# Altium footprint library IDETEC.PcbLib: 275 footprints (part 10 of 18)
Each footprint in its own frame and in the unit in brackets; x right, y up, seen from the top. Pads: shape width x height; smd on the part's side, far side on the other; paste and mask are expansions set on the pad; w line width, h text height; cw(c..) or ccw(c..) is an arc to the next point about the centre after c.
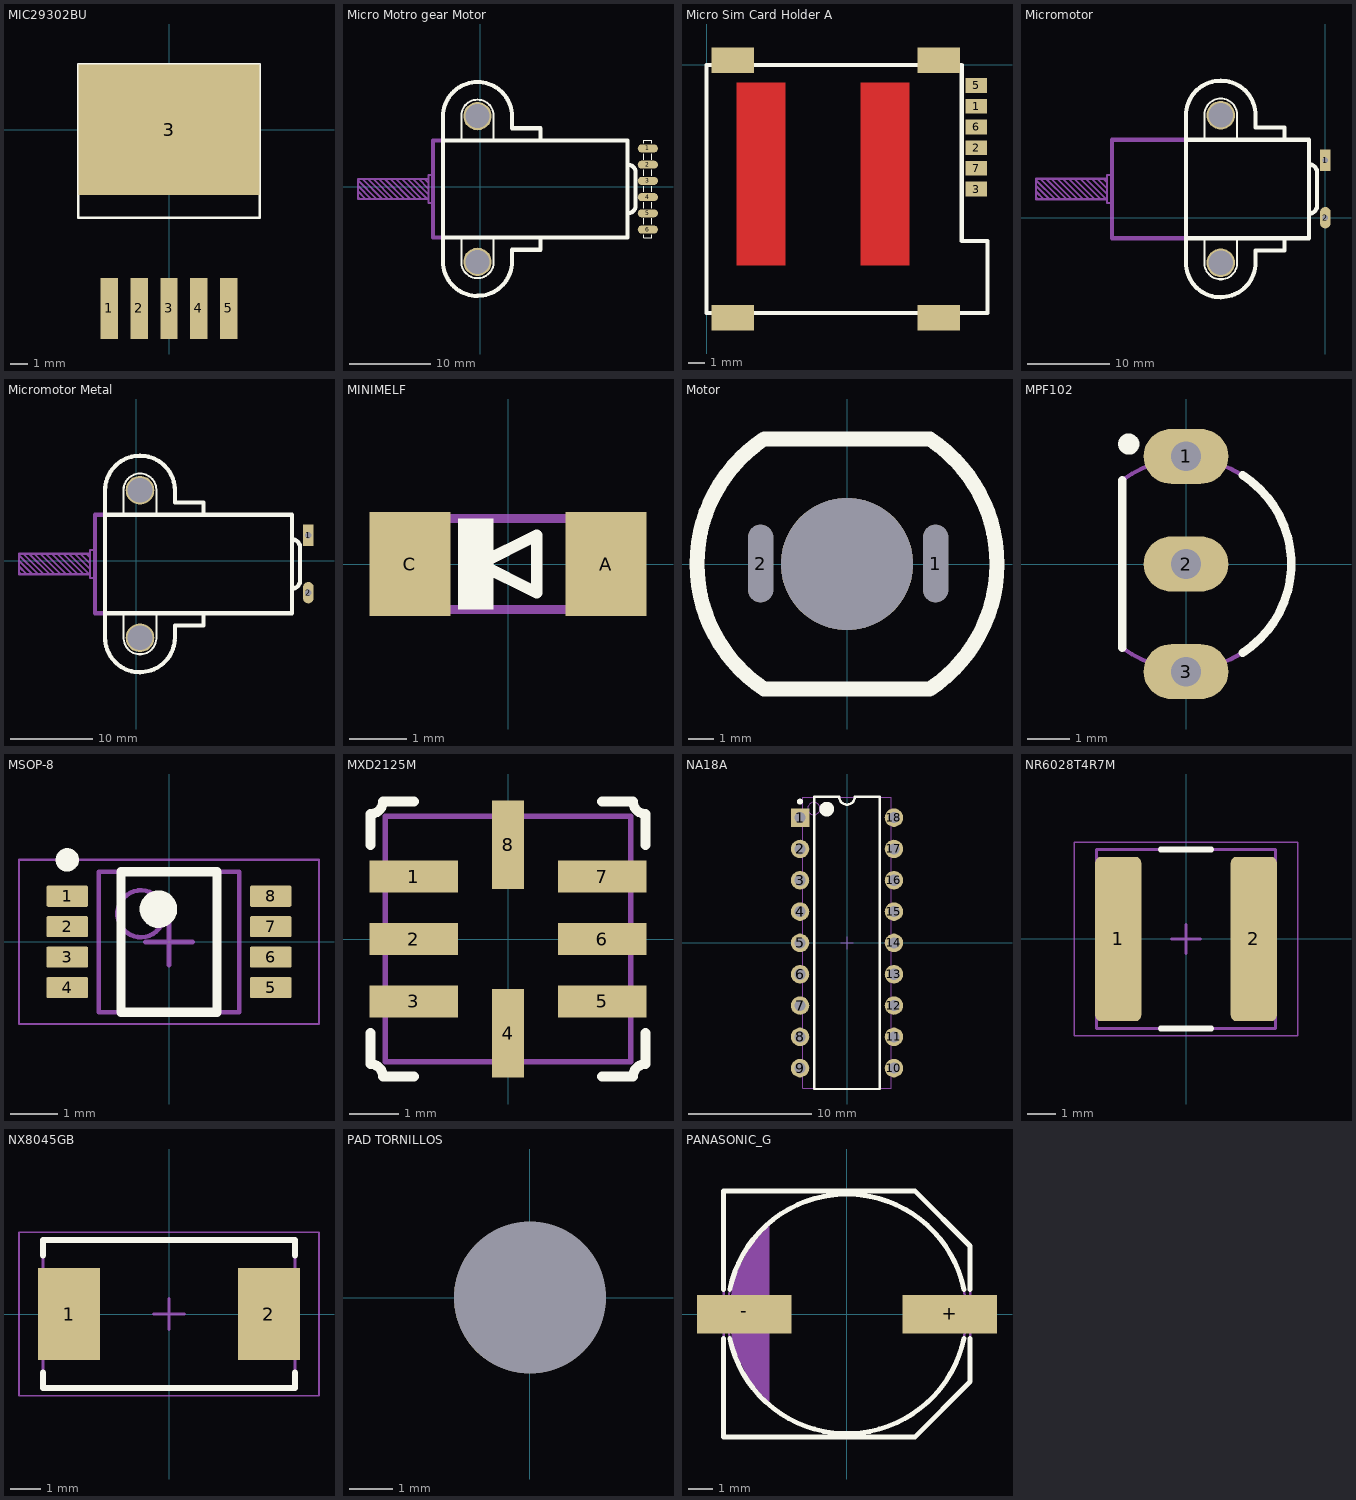
[diagram p9: the footprints below, top view; thin cyan lines are the x and y axes]

## MIC29302BU [mm] "MIC29302BU"
pads (6):
  rect 1x3.5 smd: 1(-3.404,-10.212) 2(-1.702,-10.212) 3(0,-10.212) 4(1.702,-10.212) 5(3.404,-10.212)
  rect 10.363x7.477 smd: 3(0,0)
Top Overlay:
  lines w0.15: -5.181,-5.042 -5.181,3.738 5.181,3.738 5.181,-5.042 -5.181,-5.042
3D body "User Library-TO-263-5.STEP": height 4.56, standoff 0, extent -5.085,-10.815 5.075,3.2

## Micro Motro gear Motor [mm] "micromotor con encoder"
height 3
pads (8):
  oval 2.5x1 smd: 1(20.69,4.75) 2(20.69,2.75) 3(20.69,0.75) 4(20.69,-1.25) 5(20.69,-3.25) 6(20.69,-5.25)
  round 3.5 hole 3: ""(-0.335,-9.25) ""(-0.335,8.75)
Bottom Layer:
  lines w0.051: 21.19,-0.24 21.19,-0.24
Top Overlay:
  lines w0.051: 20.19,-5.89 20.19,-6.29 21.19,-6.29 21.19,-5.89 ; 20.19,-4.62 20.19,-3.88 ; 20.19,-2.62 20.19,-1.88 ; 20.19,-0.62 20.19,0.12 ; 20.19,1.38 20.19,2.12 ; 20.19,3.38 20.19,4.12 ; 20.19,5.38 20.19,5.75 ; 20.19,5.76 21.19,5.76 21.19,5.39 ; 21.19,-4.62 21.19,-3.88 ; 21.19,-2.62 21.19,-1.88 ; 21.19,-0.62 21.19,0.12 ; 21.19,1.38 21.19,2.12 ; 21.19,3.38 21.19,4.12
  lines w0.25: -2.335,-9.375 -2.335,-6.25 ; -2.335,5.75 -2.335,8.825 ; -2.334,8.826 cw(c-0.335,8.775) 1.664,8.826 1.665,5.75 ; -2.331,-9.375 ccw(c-0.335,-9.257) 1.662,-9.375 ; 1.665,-9.375 1.665,-6.35
  lines w0.5: -4.61,5.75 18.19,5.75 18.19,-0.25 18.19,-6.25 -4.61,-6.25 ; -4.585,-6.25 -4.585,-9.25 ccw(c-0.36,-9.225) -0.335,-13.45 ; -4.585,-6.225 -4.585,5.75 -4.585,8.75 cw(c-0.36,8.725) -0.335,12.95 cw(c-0.31,8.725) 3.915,8.75 3.915,7.25 7.415,7.25 7.415,5.75 ; -0.335,-13.425 ccw(c-0.297,-9.213) 3.915,-9.25 3.915,-7.75 7.415,-7.75 7.415,-6.25 ; 18.19,-3.25 ccw(c18.19,-2.25) 19.19,-2.25 19.19,-0.25 19.19,1.75 ccw(c18.19,1.75) 18.19,2.75 ; -4.61,-6.25 -4.61,-6.25
Mechanical 1:
  lines w0.25: -15.085,-1.25 -14.835,-1.5 ; -15.085,-0.55 -14.135,-1.5 ; -15.085,0.15 -13.435,-1.5 ; -15.085,0.825 -12.76,-1.5 ; -14.56,1 -12.06,-1.5 ; -13.86,1 -11.36,-1.5 ; -13.21,1 -10.71,-1.5 ; -12.51,1 -10.01,-1.5 ; -11.81,1 -9.31,-1.5 ; -11.11,1 -8.61,-1.5 ; -10.41,1 -7.91,-1.5 ; -9.71,1 -7.21,-1.5 ; -9.01,1 -6.51,-1.5 ; -8.31,1 -6.41,-0.9 ; -7.61,1 -6.41,-0.2 ; -6.91,1 -6.41,0.5 ; -6.41,1 -15.085,1 -15.085,-1.5 -6.51,-1.5 ; -5.81,-1.95 -6.41,-1.95 -6.41,1.45 -5.81,1.45 ; -6.51,-1.5 -6.51,-1.5
  lines w0.5: -4.61,-6.25 -5.81,-6.25 -5.81,5.75 -4.585,5.75
3D body "sop.step": height 11.5, standoff 0, extent -4.81,-13.62 6.69,13.025
3D body "User Library-hp 1-100.STEP": height 10, standoff 0, extent -13.857,-6.225 19.237,5.775
3D body "Pololu-Wheel.STEP": height 20.98, standoff -10.98, extent -16.028,-15.83 -7.528,16.13

## Micro Sim Card Holder A [mm] "Micro Sim Card Holder A"
pads (10):
  rect 1.34x0.9 smd: 1(16.525,-2.53) 2(16.525,-5.07) 3(16.525,-7.61) 5(16.525,-1.26) 6(16.525,-3.8) 7(16.525,-6.34)
  rect 2.61x1.56 smd: ""(1.61,-15.495) ""(1.61,0.285) ""(14.24,-15.495) ""(14.24,0.285)
Top Layer:
  rectangle: 1.83,-12.3 4.83,-1.08
  rectangle: 9.43,-12.3 12.43,-1.08
Top Overlay:
  lines w0.254: 0,-15.21 0,0 15.64,0 15.64,-10.8 17.21,-10.8 17.21,-15.21 0,-15.21
3D body "2174803-2.stp": height 1.31, standoff -0.58, extent -0.006,-15.352 15.994,0.138

## Micromotor [mm] "gearmotor is a miniature (0.94\" x 0.39\" x 0.47\"), low-current brushed DC motor with 30:1"
height 10
pads (4):
  rect 1.3x2.6 hole 0.65: 1(0,7)
  oval 1.3x2.6 hole 0.65: 2(0,0)
  round 3.5 hole 3: ""(-12.75,-5.5) ""(-12.75,12.5)
Top Overlay:
  lines w0.25: -14.75,-5.625 -14.75,-2.5 ; -14.75,9.5 -14.75,12.575 cw(c-12.75,12.525) -10.751,12.576 -10.75,9.5 ; -14.746,-5.625 ccw(c-12.75,-5.507) -10.754,-5.625 ; -10.75,-5.625 -10.75,-2.6
  lines w0.5: -17,-2.525 -17,9.475 ; -17,9.5 -17,12.5 cw(c-12.775,12.475) -12.75,16.7 cw(c-12.725,12.475) -8.5,12.5 -8.5,11 -5,11 -5,9.5 ; -16.975,9.5 -2,9.5 -2,3.5 -2,-2.5 -17,-2.5 -17,-5.5 ccw(c-12.775,-5.475) -12.75,-9.7 ; -12.75,-9.675 ccw(c-12.712,-5.463) -8.5,-5.5 -8.5,-4 -5,-4 -5,-2.5 ; -2,0.5 ccw(c-2,1.5) -1,1.5 -1,3.5 -1,5.5 ccw(c-2,5.5) -2,6.5
Mechanical 1:
  lines w0.25: -35.275,2.5 -35.025,2.25 ; -35.275,3.2 -34.325,2.25 ; -35.275,3.9 -33.625,2.25 ; -35.275,4.575 -32.95,2.25 ; -34.75,4.75 -32.25,2.25 ; -34.05,4.75 -31.55,2.25 ; -33.4,4.75 -30.9,2.25 ; -32.7,4.75 -30.2,2.25 ; -32,4.75 -29.5,2.25 ; -31.3,4.75 -28.8,2.25 ; -30.6,4.75 -28.1,2.25 ; -29.9,4.75 -27.4,2.25 ; -29.2,4.75 -26.7,2.25 ; -28.5,4.75 -26.6,2.85 ; -27.8,4.75 -26.6,3.55 ; -27.1,4.75 -26.6,4.25 ; -26.6,4.75 -35.275,4.75 -35.275,2.25 -26.7,2.25 ; -26,1.8 -26.6,1.8 -26.6,5.2 -26,5.2 ; -26.7,2.25 -26.7,2.25
  lines w0.5: -16.95,-2.5 -26,-2.5 -26,9.5 -16.95,9.5
3D body "soporte.stp": height 11.5, standoff 0, extent -17.25,-9.82 -5.75,16.825
3D body "User Library-hp 1-100.STEP": height 10, standoff 0, extent -34.047,-2.475 -0.953,9.525
3D body "Pololu-Wheel.STEP": height 20.98, standoff -10.98, extent -36.218,-12.08 -27.718,19.88

## Micromotor Metal [mm] "Mcromotor con soporte adelante"
pads (4):
  rect 1.3x2.6 hole 0.81: 1(21,3.1)
  oval 1.3x2.6 hole 0.81: 2(21,-3.9)
  round 3.5 hole 3: ""(0.475,-9.4) ""(0.475,8.6)
Top Overlay:
  lines w0.25: -1.525,-9.525 -1.525,-6.4 ; -1.525,5.6 -1.525,8.675 ; -1.524,8.676 cw(c0.475,8.625) 2.474,8.676 ; -1.521,-9.525 ccw(c0.475,-9.407) 2.471,-9.525 ; 2.475,-9.525 2.475,-6.5 ; 2.475,5.6 2.475,8.675
  lines w0.5: -3.8,5.6 19,5.6 19,-0.4 19,-6.4 -3.8,-6.4 ; -3.775,-6.4 -3.775,-9.4 ccw(c0.45,-9.375) 0.475,-13.6 ; -3.775,-6.375 -3.775,5.6 -3.775,8.6 cw(c0.45,8.575) 0.475,12.8 cw(c0.5,8.575) 4.725,8.6 4.725,7.1 8.225,7.1 8.225,5.6 ; 0.475,-13.575 ccw(c0.513,-9.363) 4.725,-9.4 4.725,-7.9 8.225,-7.9 8.225,-6.4 ; 19,-3.4 ccw(c19,-2.4) 20,-2.4 20,-0.4 20,1.6 ccw(c19,1.6) 19,2.6 ; -3.8,-6.4 -3.8,-6.4
Mechanical 1:
  lines w0.25: -14.275,-1.4 -14.025,-1.65 ; -14.275,-0.7 -13.325,-1.65 ; -14.275,0 -12.625,-1.65 ; -14.275,0.675 -11.95,-1.65 ; -13.75,0.85 -11.25,-1.65 ; -13.05,0.85 -10.55,-1.65 ; -12.4,0.85 -9.9,-1.65 ; -11.7,0.85 -9.2,-1.65 ; -11,0.85 -8.5,-1.65 ; -10.3,0.85 -7.8,-1.65 ; -9.6,0.85 -7.1,-1.65 ; -8.9,0.85 -6.4,-1.65 ; -8.2,0.85 -5.7,-1.65 ; -7.5,0.85 -5.6,-1.05 ; -6.8,0.85 -5.6,-0.35 ; -6.1,0.85 -5.6,0.35 ; -5.6,0.85 -14.275,0.85 -14.275,-1.65 -5.7,-1.65 ; -5,-2.1 -5.6,-2.1 -5.6,1.3 -5,1.3 ; -5.7,-1.65 -5.7,-1.65
  lines w0.5: -3.8,-6.4 -5,-6.4 -5,5.6 -3.775,5.6
3D body "Pololu-Wheel.STEP": height 20.98, standoff -10.98, extent -15.218,-15.98 -6.718,15.98
3D body "User Library-hp 1-100.STEP": height 10, standoff 0, extent -13.047,-6.375 20.047,5.625
3D body "sop.step": height 11.5, standoff 0, extent -4,-13.77 7.5,12.875

## MINIMELF [mm] "MINIMELF"
pads (2):
  rect 1.4x1.8 smd: A(1.7,0) C(-1.7,0)
Top Overlay:
  rectangle: -0.864,-0.787 -0.254,0.787
  lines w0.203: -0.5,0 0.5,-0.5 0.5,0.5 -0.5,0
Mechanical 16:
  rectangle: 1.295,-0.864 1.854,0.864
  rectangle: -1.854,-0.864 -1.295,0.864
  lines w0.152: -1.321,-0.787 1.321,-0.787 ; -1.321,0.787 1.321,0.787
3D body "User Library-D1206.STEP": height 0.85, standoff 0, extent -1.675,-0.865 1.675,0.865

## Motor [mm]
height 9
pads (3):
  oval 1x3.1 hole 1 slot 3.1 at 90 deg: 1(3.545,0.019) 2(-3.455,0.019)
  round 5.3 hole 5.3 unplated: ""(0,0)
Top Overlay:
  lines w0.6: -3.318,-5 3.303,-5 ; -3.318,-4.999 cw(c0,0) -3.309,5.005 ; -3.306,5 3.323,5 ; 3.303,-5.009 ccw(c0,0) 3.323,4.996
Multi-Layer:
  region: 2.707,-1.96 3.045,-1.031 3.054,-1.129 3.129,-1.309 3.267,-1.447 3.447,-1.521 3.545,-1.531 3.642,-1.521 3.823,-1.447 3.961,-1.309 4.035,-1.129 4.045,-1.031 4.045,1.069 4.035,1.166 3.961,1.347 3.823,1.485 3.642,1.559 3.545,1.569 3.447,1.559 3.267,1.485 3.129,1.347 3.054,1.166 3.045,1.069 2.707,1.998 2.711,2 2.796,2.076 2.991,2.196 3.205,2.277 3.43,2.319 3.545,2.319 3.668,2.319 3.909,2.271 4.137,2.177 4.342,2.04 4.516,1.866 4.653,1.661 4.747,1.434 4.795,1.192 4.795,1.069 4.795,-1.031 4.795,-1.154 4.747,-1.396 4.653,-1.623 4.516,-1.828 4.342,-2.002 4.137,-2.139 3.909,-2.233 3.668,-2.281 3.545,-2.281 3.43,-2.281 3.203,-2.24 2.988,-2.158 2.792,-2.038
  region: -3.955,-1.031 -3.955,1.069 -3.946,1.166 -3.871,1.347 -3.733,1.485 -3.553,1.559 -3.455,1.569 -3.358,1.559 -3.177,1.485 -3.039,1.347 -2.965,1.166 -2.955,1.069 -2.617,1.998 -2.613,2.003 -2.699,2.079 -2.897,2.199 -3.113,2.28 -3.34,2.32 -3.455,2.319 -3.578,2.319 -3.82,2.271 -4.047,2.177 -4.252,2.04 -4.426,1.866 -4.563,1.661 -4.657,1.434 -4.705,1.192 -4.705,1.069 -4.705,-1.031 -4.705,-1.154 -4.657,-1.396 -4.563,-1.623 -4.426,-1.828 -4.252,-2.002 -4.047,-2.139 -3.82,-2.233 -3.578,-2.281 -3.455,-2.281 -3.341,-2.281 -3.115,-2.239 -2.902,-2.158 -2.706,-2.038 -2.621,-1.962 -2.617,-1.96 -2.955,-1.031 -2.965,-1.129 -3.039,-1.309 -3.177,-1.447 -3.358,-1.521 -3.455,-1.531 -3.553,-1.521 -3.733,-1.447 -3.871,-1.309 -3.946,-1.129
3D body "3x1.5.STEP": height 23.01, standoff 17.05, extent -37.984,-7.756 37.984,7.756
3D body "Pololu-Micro-Metal-Gearmotor.STEP": height 21.2, standoff -1.5, extent -5.955,-4.981 6.045,5.019

## MPF102 [mm] "TO, Flat Index; 3 In-Line, Axial Leads; Body Dia. 4.5mm; Leads 0.51 x 0.48 mm (max)"
height 6.86
pads (3):
  oval 2x1.3 hole 0.7: 1(0,2.54) 2(0,0) 3(0,-2.54)
Top Overlay:
  circle w0.25: c-1.35,2.83 r0.125
  lines w0.2: -1.5,-1.98 -1.5,1.98 ; 1.334,-2.096 ccw(c0,0) 1.334,2.096
Mechanical 13:
  lines w0.1: -1.5,-1.98 ccw(c0,0) -1.5,1.98 -1.5,-1.98
Mechanical 15:
  lines w0.1: -0.5,0 0.5,0 ; 0,-0.5 0,0.5
3D body "PN2222ATF.STEP": height 9.35, standoff -4.85, extent -1.6,-2.78 2.4,2.78

## MSOP-8 [mm] "CFP, 8-Leads, Body 3,00x3,00mm (max), Pitch 0,65mm, IPC Medium Density"
height 1.1
pads (8):
  rrect15% 0.89x0.45 smd: 1(-2.17,0.975) 2(-2.17,0.325) 3(-2.17,-0.325) 4(-2.17,-0.975) 5(2.17,-0.975) 6(2.17,-0.325) 7(2.17,0.325) 8(2.17,0.975)
Top Overlay:
  circle w0.4: c-0.225,0.7 r0.2
  circle w0.25: c-2.17,1.75 r0.125
  lines w0.2: -1.025,-1.5 -1.025,1.5 1.025,1.5 1.025,-1.5 -1.025,-1.5
Mechanical 13:
  circle w0.1: c-0.6,0.6 r0.5
  lines w0.1: -1.5,-1.5 -1.5,1.5 1.5,1.5 1.5,-1.5 -1.5,-1.5
Mechanical 15:
  lines w0.05: -3.2,-1.75 -3.2,1.75 3.2,1.75 3.2,-1.75 -3.2,-1.75
  lines w0.1: -0.5,0 0.5,0 ; 0,-0.5 0,0.5
3D body "User Library-TSSOP-8 3_1x3_1.STEP": height 1.06, standoff -0.04, extent -2.5,-1.55 2.5,1.55

## MXD2125M [mm] "Dual Axis Accelerometer with  Digital Outputs"
height 5
pads (8):
  rect 1.8x0.65 smd: 1(-1.915,1.27) 2(-1.915,0) 3(-1.915,-1.27) 5(1.915,-1.27) 6(1.915,0) 7(1.915,1.27)
  rect 0.65x1.8 smd: 4(0,-1.915) 8(0,1.915)
Top Overlay:
  lines w0.2: -2.8,-1.914 -2.8,-2.546 cw(c-2.8,-2.8) -2.546,-2.8 -1.914,-2.8 ; -2.8,1.914 -2.8,2.546 ccw(c-2.8,2.8) -2.546,2.8 -1.914,2.8 ; 1.914,-2.8 2.546,-2.8 cw(c2.8,-2.8) 2.8,-2.546 2.8,-1.914 ; 1.914,2.8 2.546,2.8 ccw(c2.8,2.8) 2.8,2.546 2.8,1.914
Mechanical 13:
  lines w0.12: -2.5,-2.5 2.5,-2.5 2.5,2.5 -2.5,2.5 -2.5,-2.5
3D body "MXD2020.stp": height 1.99, standoff 0, extent -2.5,-2.5 2.5,2.5

## NA18A [mm] "DIP, 18-Leads, Row Spacing 7.62mm, Pitch 2.54mm, Body 22.86x6.35mm"
height 5.34
pads (18):
  rect 1.5x1.5 hole 0.9: 1(-3.81,10.16)
  round 1.5 hole 0.9: 2(-3.81,7.62) 3(-3.81,5.08) 4(-3.81,2.54) 5(-3.81,0) 6(-3.81,-2.54) 7(-3.81,-5.08) 8(-3.81,-7.62) 9(-3.81,-10.16) 10(3.81,-10.16) 11(3.81,-7.62) 12(3.81,-5.08) 13(3.81,-2.54) 14(3.81,0) 15(3.81,2.54) 16(3.81,5.08) 17(3.81,7.62) 18(3.81,10.16)
Top Overlay:
  circle w0.25: c-3.81,11.46 r0.125
  circle w0.6: c-1.65,10.85 r0.3
  lines w0.2: -2.65,-11.85 -2.65,11.85 -0.635,11.85 ccw(c0,11.85) 0.635,11.85 2.65,11.85 2.65,-11.85 -2.65,-11.85
Mechanical 13:
  circle w0.1: c-2.7,10.9 r0.5
  lines w0.1: -3.6,-11.8 -3.6,11.8 3.6,11.8 3.6,-11.8 -3.6,-11.8
Mechanical 15:
  lines w0.1: -0.5,0 0.5,0 ; 0,-0.5 0,0.5
3D body "SW3dPS-DIP18-300.STEP": height 5.08, standoff -2.49, extent -3.935,-11.495 3.935,11.495

## NR6028T4R7M [mm] "Precision Wire Wound Inductor 4.7uH, 2-Leads, Body 6,10x6,10mm, IPC Medium Density"
height 2.8
pads (2):
  rrect25% 1.6x5.7 smd: 1(-2.35,0) 2(2.35,0)
Top Overlay:
  lines w0.2: -0.875,-3.1 0.875,-3.1 ; -0.875,3.1 0.875,3.1
Mechanical 13:
  lines w0.1: -3.1,-3.1 -3.1,3.1 3.1,3.1 3.1,-3.1 -3.1,-3.1
Mechanical 15:
  lines w0.05: -3.875,-3.35 -3.875,3.35 3.875,3.35 3.875,-3.35 -3.875,-3.35
  lines w0.1: -0.5,0 0.5,0 ; 0,-0.5 0,0.5
3D body "WE-LQS_6045_LQS.stp": height 4.55, standoff 0.05, extent -3,-3 3,3

## NX8045GB [mm] "Crystal SMD, 2-Leads, Body 8,10x4,60mm, IPC Medium Density"
height 2
pads (2):
  rect 2x3 smd: 1(-3.25,0) 2(3.25,0)
Top Overlay:
  lines w0.2: -4.1,-1.9 -4.1,-2.4 4.1,-2.4 4.1,-1.9 ; -4.1,1.9 -4.1,2.4 4.1,2.4 4.1,1.9
Mechanical 13:
  lines w0.1: -4.1,-2.35 4.1,-2.35 4.1,2.35 -4.1,2.35 -4.1,-2.35
Mechanical 15:
  lines w0.05: -4.875,-2.65 4.875,-2.65 4.875,2.65 -4.875,2.65 -4.875,-2.65
  lines w0.1: -0.5,0 0.5,0 ; 0,-0.5 0,0.5
3D body "Crystal.step": height 1.8, standoff 0, extent -4,-2.25 4,2.25

## PAD TORNILLOS [mm] "hole 3,5mm"
pads (1):
  round 3.5 hole 3.5: ""(0,0)
Multi-Layer:
  region: -2.286,3.082 -2.5,2.922 -2.881,2.548 -3.206,2.125 -3.469,1.66 -3.666,1.164 -3.792,0.645 -3.844,0.113 -3.823,-0.42 -3.728,-0.945 -3.561,-1.453 -3.326,-1.932 -3.026,-2.374 -2.668,-2.77 -2.259,-3.113 -1.806,-3.396 -1.319,-3.613 -0.806,-3.761 -0.277,-3.836 0.257,-3.838 0.786,-3.765 1.3,-3.62 1.788,-3.405 2.243,-3.125 2.654,-2.784 2.834,-2.587 2.834,3.082

## PANASONIC_G [mil] "PANASONIC_G"
pads (2):
  rect 154x63 smd: +(168,0) -(-167.32,0)
Top Overlay:
  lines w8: -200.79,-39.37 -200.79,-200.79 111,-200.79 201,-110.24 201,-39.37 ; -200.79,40 -200.79,201 111,201 201,111 201,40 ; -190.94,-39.37 ccw(c0.03,0.01) 191,-39.37 ; -190.94,40 cw(c0.03,0.62) 191,40
Mechanical 16:
  circle w4: c0,0 r195
  rectangle: 193,-17.72 231,18
  rectangle: -230.32,-17.72 -192.91,18
  region: -129.92,142 -159.45,109 -183.07,62 -190.94,18 -190.95,-17.72 -183.07,-61.02 -159.45,-108.27 -129.92,-141.73
  lines w4: -127.95,-143.7 -127.95,146 ; -200.79,-200.79 -200.79,201 111,201 201,111 201,-110.24 111,-200.79 -200.79,-200.79
3D body "User Library-ALU-G.STEP": height 401.57, standoff 0, extent -228.01,-202.76 228.69,202.76

## PCBComponent_1 [mm]